# Altium footprint library Connector.PcbLib: 231 footprints (part 11 of 15)
Each footprint in its own frame and in the unit in brackets; x right, y up, seen from the top. Pads: shape width x height; smd on the part's side, far side on the other; paste and mask are expansions set on the pad; w line width, h text height; cw(c..) or ccw(c..) is an arc to the next point about the centre after c.
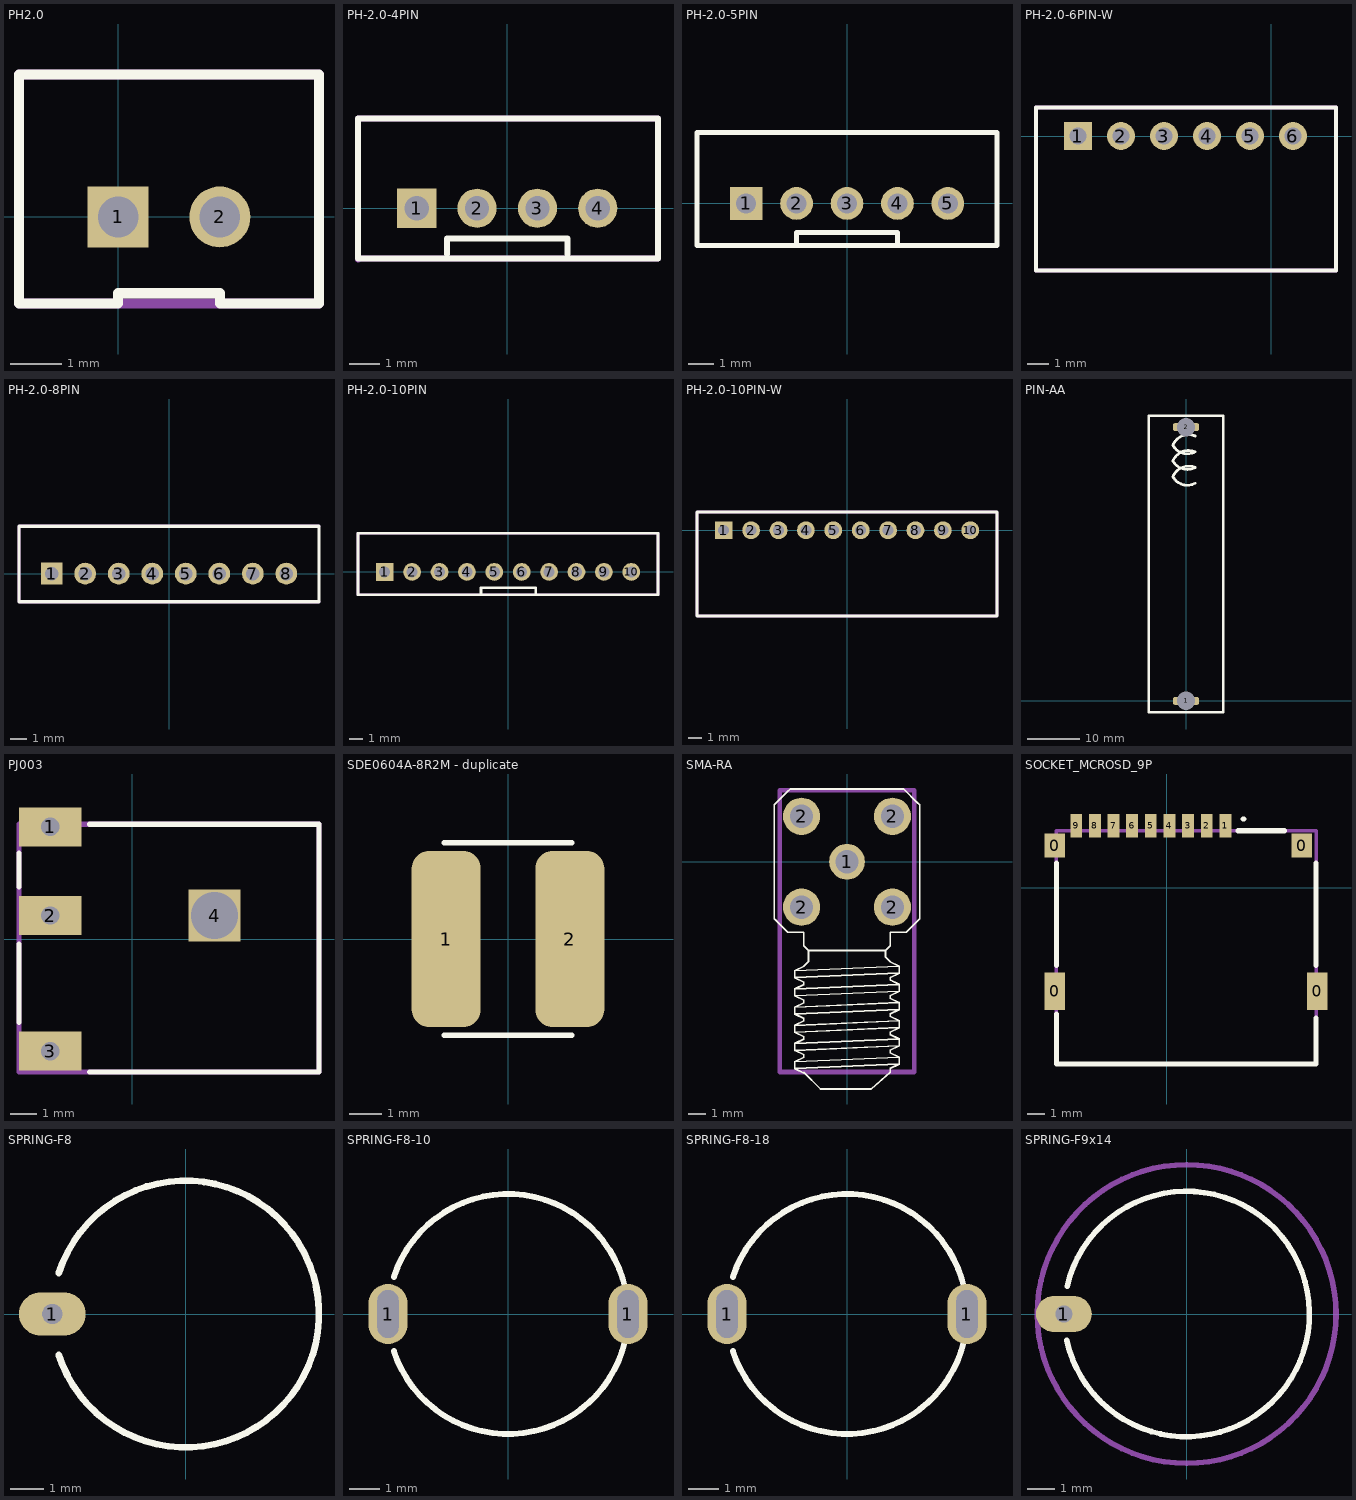
[diagram p10: the footprints below, top view; thin cyan lines are the x and y axes]

## PH2.0 [mm]
pads (2):
  rect 1.2x1.2 hole 0.8: 1(0,0)
  round 1.2 hole 0.8: 2(2,0)
Top Overlay:
  lines w0.2: -1.95,-1.7 -1.95,2.8 3.95,2.8 3.95,-1.7 2,-1.7 2,-1.5 0,-1.5 0,-1.7 -1.95,-1.7
Mechanical 13:
  lines w0.2: -1.95,-1.7 -1.95,2.8 3.95,2.8 3.95,-1.7 -1.95,-1.7
  text ".Designator" at -1,0.378 h2
3D body "B2B-PH-K-S.STEP": height 6, standoff -3.4, extent -1.95,-1.7 3.95,2.8

## PH-2.0-4PIN [mm]
pads (4):
  rect 1.3x1.3 hole 0.8: 1(-3,0)
  round 1.3 hole 0.8: 2(-1,0) 3(1,0) 4(3,0)
Top Overlay:
  lines w0.2: -2,-1.525 -2,-1 2,-1 2,-1.525 ; -4.95,-1.675 -4.95,2.974 5,2.974 5,-1.675 -4.95,-1.675
Mechanical 13:
  lines w0.2: -4.95,-1.7 -4.93,-1.7 -4.93,-1.675 5,-1.675 5,2.974 -4.95,2.974 -4.95,-1.7
  text ".Designator" at -2.575,0.375 h1.5
3D body "JST - PH - Thru (V) - 4Pin - 2.00mm.stp": height 5.89, standoff -3.05, extent -4.93,-1.7 4.93,2.974

## PH-2.0-5PIN [mm]
pads (5):
  rect 1.3x1.3 hole 0.8: 1(-4,0)
  round 1.3 hole 0.8: 2(-2,0) 3(0,0) 4(2,0) 5(4,0)
Top Overlay:
  lines w0.2: -2,-1.675 -2,-1.15 2,-1.15 2,-1.675 ; -5.95,-1.675 5.95,-1.675 5.95,2.825 -5.95,2.825 -5.95,-1.675
Mechanical 13:
  text ".Designator" at -3.575,0.375 h1.5
3D body "B5B-PH-K-S.STEP": height 6, standoff -3.4, extent -5.95,-1.675 5.95,2.825

## PH-2.0-6PIN-W [mm]
pads (6):
  rect 1.3x1.3 hole 0.8: 1(-9,0)
  round 1.3 hole 0.8: 2(-7,0) 3(-5,0) 4(-3,0) 5(-1,0) 6(1,0)
Top Overlay:
  lines w0.2: -10.95,-6.25 -10.95,1.325 3,1.325 3,-6.25 -10.95,-6.25
Mechanical 13:
  lines w0.2: -10.95,-6.25 -10.95,1.325 3,1.325 3,-6.25 -10.95,-6.25
  text ".Designator" at -7.5,-2 h1.5
3D body "JST-S6B-PH-K-S.STEP.STEP": height 4.8, standoff -3.4, extent -10.925,-6.275 2.975,1.325

## PH-2.0-8PIN [mm]
pads (8):
  rect 1.3x1.3 hole 0.8: 1(-7,0)
  round 1.3 hole 0.8: 2(-5,0) 3(-3,0) 4(-1,0) 5(1,0) 6(3,0) 7(5,0) 8(7,0)
Top Overlay:
  lines w0.2: -8.95,-1.675 8.95,-1.675 8.95,2.825 -8.95,2.825 -8.95,-1.675
Mechanical 13:
  lines w0.2: 8.95,-1.675 -8.95,-1.675 -8.95,2.825 8.95,2.825
  text ".Designator" at -3.65,0 h1.5
3D body "JST - PH - Thru (V) - 8Pin - 2.00mm.stp": height 5.89, standoff -3.05, extent -8.93,-1.7 8.931,2.974

## PH-2.0-10PIN [mm]
pads (10):
  rect 1.3x1.3 hole 0.8: 1(-9,0)
  round 1.3 hole 0.8: 2(-7,0) 3(-5,0) 4(-3,0) 5(-1,0) 6(1,0) 7(3,0) 8(5,0) 9(7,0) 10(9,0)
Top Overlay:
  lines w0.2: -1.975,-1.675 -1.975,-1.15 2.025,-1.15 2.025,-1.675 ; -10.95,-1.675 10.95,-1.675 10.95,2.825 -10.95,2.825 -10.95,-1.675
Mechanical 13:
  lines w0.2: -10.95,-1.675 10.95,-1.675 10.95,2.825 -10.95,2.825 -10.95,-1.675
  text ".Designator" at -2.875,0.35 h1.5
3D body "JST - PH - Thru (V) - 10Pin - 2.00mm.stp": height 5.89, standoff -3.05, extent -10.93,-1.7 10.93,2.974

## PH-2.0-10PIN-W [mm]
pads (10):
  rect 1.3x1.3 hole 0.8: 1(-9,0)
  round 1.3 hole 0.8: 2(-7,0) 3(-5,0) 4(-3,0) 5(-1,0) 6(1,0) 7(3,0) 8(5,0) 9(7,0) 10(9,0)
Top Overlay:
  lines w0.2: -10.95,-6.25 10.95,-6.25 10.95,1.325 -10.95,1.325 -10.95,-6.25
Mechanical 13:
  lines w0.2: -10.95,-6.25 10.95,-6.25 10.95,1.325 -10.95,1.325 -10.95,-6.25
  text ".Designator" at -3.1,-2.5 h1.5
3D body "S10B-PH-K-S.STEP": height 4.8, standoff -3.4, extent -10.95,-6.225 10.95,1.375

## PIN-AA [mm]
pads (2):
  rrect50% 5x1.5 hole 3.5 square: 1(0,0) 2(0,52.2)
Top Overlay:
  lines w0.5: 1.75,41.5 cw(c0.25,44.25) -2.5,42.75 cw(c0.5,41.5) 1.75,44.5 cw(c0.25,47.25) -2.5,45.75 cw(c0.5,44.5) 1.75,47.5 cw(c0.25,50.25) -2.5,48.75 cw(c0.5,47.5) 1.75,50.5 ; -7.1,-2.2 -7.1,54.4 7.1,54.4 7.1,-2.2 -7.1,-2.2
3D body "AA Batterie.step": height 14.73, standoff 0.73, extent -6.893,1 7.1,51.2
3D body: height 3, standoff 0, extent -7.1,-2.2 -4.478,54.4
3D body: height 3, standoff 0, extent 4.478,-2.2 7.1,54.4
3D body: height 15, standoff 0, extent -7.1,51.825 7.1,54.4
3D body: height 15, standoff 0, extent -7.1,-2.2 7.1,0.375

## PJ003 [mm]
pads (4):
  rect 2.4x1.5 hole 0.7 square: 1(-3.15,4.3) 2(-3.15,0.9) 3(-3.15,-4.3)
  rect 2x2 hole 1.8 square: 4(3.15,0.9)
Top Overlay:
  lines w0.2: -4.35,-3.2 -4.35,-0.2 ; -4.35,2 -4.35,3.3 ; -1.65,-5.1 7.15,-5.1 7.15,4.4 -1.65,4.4
Mechanical 13:
  lines w0.2: -4.35,-5.1 -4.35,4.4 7.15,4.4 7.15,-5.1 -4.35,-5.1
3D body: height 7, standoff 0, extent -4.35,-5.1 7.15,4.4

## SDE0604A-8R2M - duplicate [mm] "FIXED IND 8.2UH 2.8A 90 MOHM SMD"
pads (2):
  rrect50% 2.15x5.5 smd: 1(-1.925,0) 2(1.925,0)
Top Overlay:
  lines w0.16: -2,-3 2,-3 ; -2,3 2,3
3D body "SDE0604A.STP": height 4.5, standoff 0, extent -2.775,-2.59 2.804,2.61

## SMA-RA [mil]
pads (5):
  round 78.74 hole 51.18: 1(0,0)
  round 82 hole 51.18: 2(-100,-100) 2(-100,100) 2(100,-100) 2(100,100)
Top Overlay:
  lines w4: -155,-130 -160,-125 ; -95,-465 -115,-455 ; -95,-463.33 -58.33,-500 53.33,-500 95,-463.33 95,-455 115,-445 ; 160,75 160,125 155,130 125,160 -125,160 -130,155 -160,125 -160,-125 ; 160,80 160,-125 130,-155 95,-155 95,-185 85,-195 ; -160,-125 -130,-155 -95,-155 -95,-185 -85,-195 ; -115,-455 115,-445 ; -115,-455 -115,-440 ; -115,-440 115,-430 ; -115,-440 -95,-430 -95,-425 -115,-415 ; -115,-415 115,-405 ; -115,-415 -115,-400 ; -115,-400 115,-390 ; -115,-400 -95,-390 -95,-385 -115,-375 ; -115,-375 115,-365 ; -115,-375 -115,-360 ; -115,-360 115,-350 ; -115,-360 -95,-350 -95,-345 -115,-335 ; -115,-335 115,-325 ; -115,-335 -115,-320 ; -115,-320 115,-310 ; -115,-320 -95,-310 -95,-305 -115,-295 ; -115,-295 115,-285 ; -115,-295 -115,-280 ; -115,-280 115,-270 ; -115,-280 -95,-270 -95,-265 -115,-255 ; -115,-255 115,-245 ; -115,-255 -115,-240 ; -115,-240 115,-230 ; -115,-240 -95,-230 -85,-220 -85,-210 -85,-200 -85,-195 ; -85,-195 85,-195 ; 85,-195 85,-200 85,-210 95,-220 115,-230 ; 115,-445 115,-430 ; 115,-430 95,-420 95,-415 115,-405 ; 115,-405 115,-390 ; 115,-390 95,-380 95,-375 115,-365 ; 115,-365 115,-350 ; 115,-350 95,-340 95,-335 115,-325 ; 115,-325 115,-310 ; 115,-310 95,-300 95,-295 115,-285 ; 115,-285 115,-270 ; 115,-270 95,-260 95,-255 115,-245 ; 115,-245 115,-230
Mechanical 13:
  lines w10: -147.64,-462.6 147.64,-462.6 147.64,157.48 -147.64,157.48 -147.64,-462.6
  text ".Designator" at -29.53,137.8 h118.11
Mechanical 15:
  lines w10: -147.64,-462.6 -147.64,157.48 147.64,157.48 147.64,-462.6 -147.64,-462.6
  text ".Comment" at -29.53,137.8 h118.11
3D body "SMA-J-P-X-RA-TH1.step": height 394.06, standoff -149.25, extent -136.5,-457.49 139.09,137

## SOCKET_MCROSD_9P [mm]
pads (13):
  rect 1.2x2.2 smd: 0(-6.625,-6.125) 0(8.875,-6.125)
  rect 1.2x1.4 smd: 0(-6.625,2.475) 0(7.95,2.475)
  rect 0.7x1.4 smd: 1(3.449,3.645) 2(2.349,3.645) 3(1.249,3.645) 4(0.149,3.645) 5(-0.951,3.645) 6(-2.051,3.645) 7(-3.151,3.645) 8(-4.251,3.645) 9(-5.351,3.645)
Top Overlay:
  lines w0.3: -6.525,-7.478 -6.525,-10.421 8.8,-10.421 8.8,-7.696 ; -6.525,-4.593 -6.525,1.452 ; 4.196,3.35 6.937,3.35 ; 4.5,4.05 4.55,4.05 ; 8.8,-4.593 8.8,-0.925 8.8,1.452
Mechanical 13:
  lines w0.2: -6.525,-10.421 -6.525,3.35 8.8,3.35 8.8,-10.421 -6.525,-10.421
  text ".Designator" at -4.8,-0.547 h2

## SPRING-F8 [mm]
pads (1):
  oval 2x1.3 hole 0.6: 1(-4,0)
Top Overlay:
  lines w0.2: -3.807,-1.228 ccw(c0,0) 3.807,-1.228 ccw(c0,0) -3.807,1.228
Mechanical 13:
  text ".Designator" at -2.8,-0.422 h2
3D body: height 6, standoff 0, extent -4.046,-4.14 3.954,3.854

## SPRING-F8-10 [mm]
pads (2):
  oval 1.3x2 hole 0.7 slot 1.6 at 90 deg: 1(-4,0) 1(4,0)
Top Overlay:
  lines w0.2: -3.807,-1.228 ccw(c0,0) 3.807,-1.228 ccw(c0,0) -3.807,1.228
Mechanical 13:
  text ".Designator" at -2.8,-0.422 h2
3D body "User Library-f8-10-03.STEP": height 10.65, standoff -2.35, extent -4.15,-4.15 4.15,4.15

## SPRING-F8-18 [mm]
pads (2):
  oval 1.3x2 hole 0.7 slot 1.6 at 90 deg: 1(-4,0) 1(4,0)
Top Overlay:
  lines w0.2: -3.807,-1.228 ccw(c0,0) 3.807,-1.228 ccw(c0,0) -3.807,1.228
Mechanical 13:
  text ".Designator" at -2.8,-0.422 h2
3D body "User Library-f8-10-03.STEP": height 18.65, standoff 5.65, extent -4.15,-4.15 4.15,4.15
3D body "User Library-f8-10-03.STEP": height 10.65, standoff -2.35, extent -4.175,-4.15 4.125,4.15

## SPRING-F9x14 [mm]
pads (1):
  oval 2x1.3 hole 0.6: 1(-4.4,0)
Top Overlay:
  lines w0.2: -4.297,-0.945 ccw(c0,0) 4.188,-1.351 ccw(c0,0) -4.287,0.993
Mechanical 13:
  circle w0.2: c0,0 r5.355
  text ".Designator" at -2.8,-0.422 h2
3D body: height 14, standoff 0, extent -4.5,-4.5 4.5,4.5